# Altium footprint library baterries_and_accus.PcbLib: 26 footprints (part 1 of 2)
Each footprint in its own frame and in the unit in brackets; x right, y up, seen from the top. Pads: shape width x height; smd on the part's side, far side on the other; paste and mask are expansions set on the pad; w line width, h text height; cw(c..) or ccw(c..) is an arc to the next point about the centre after c.
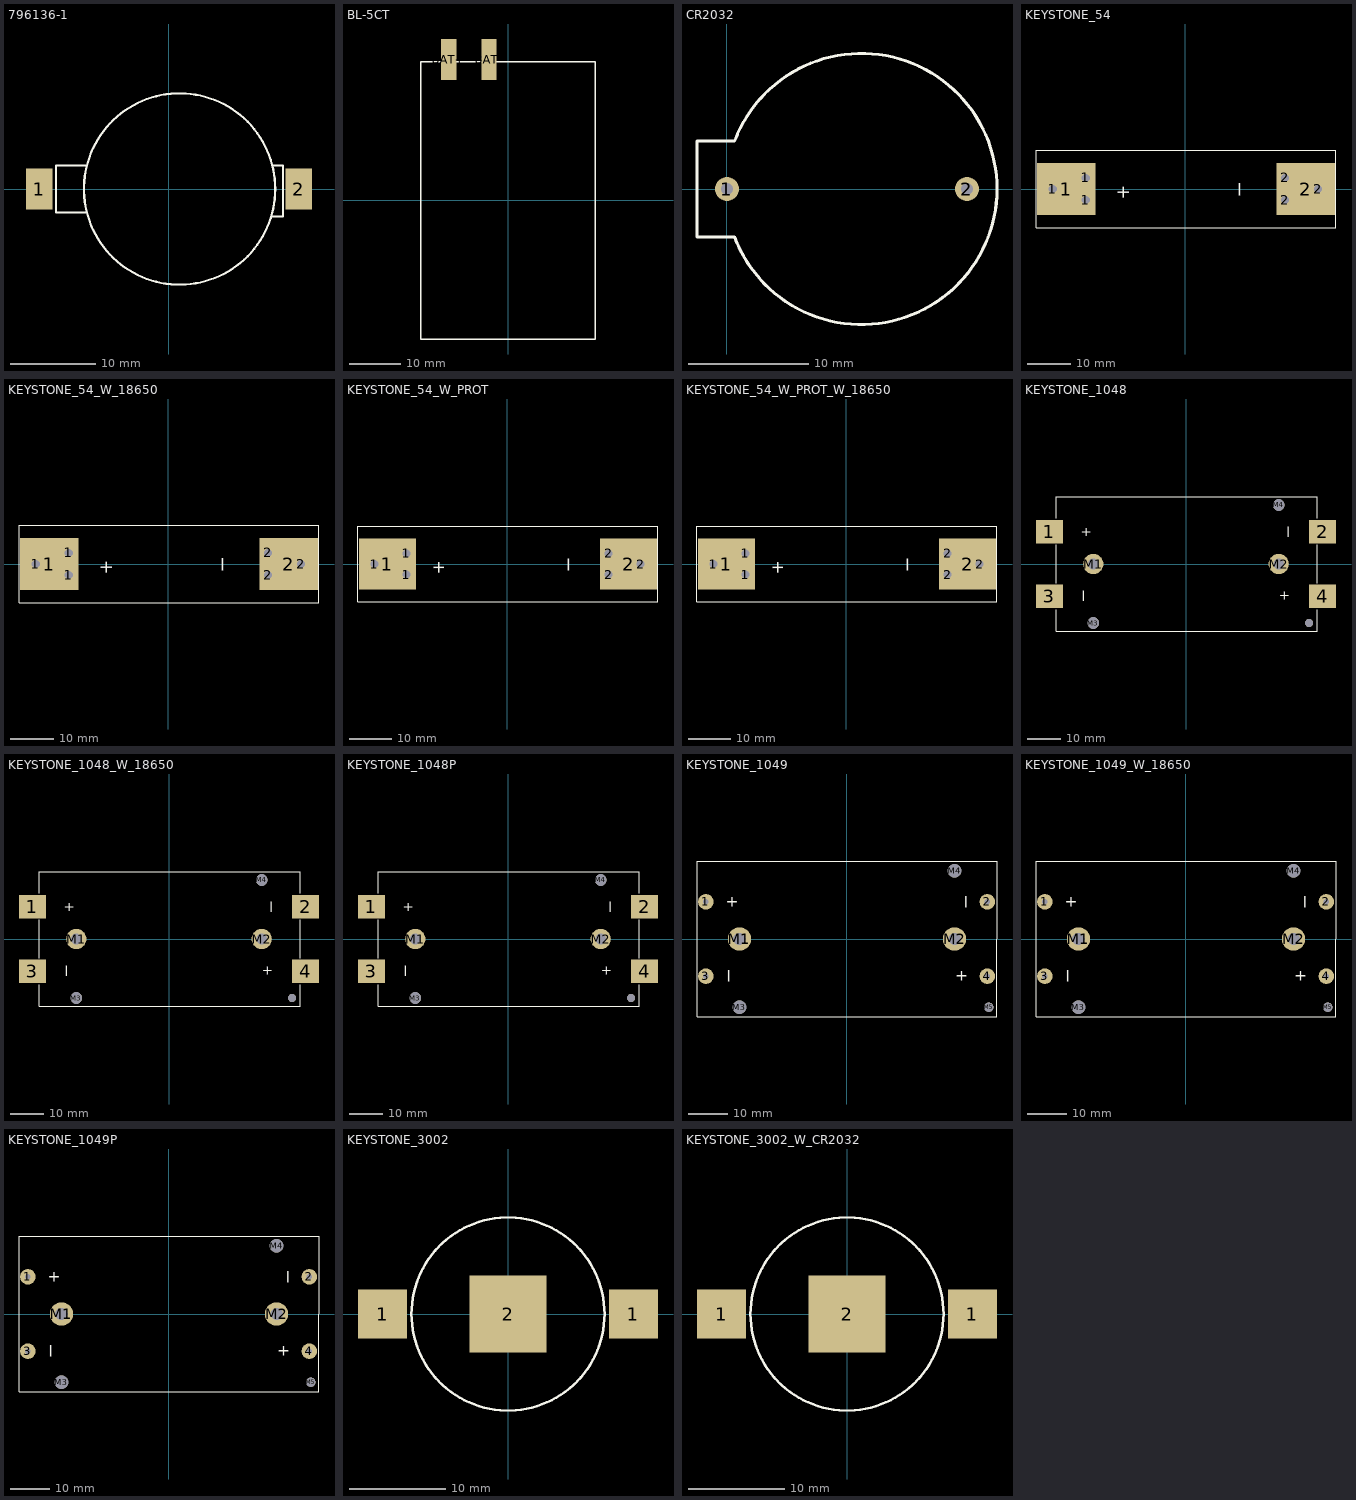
[diagram p0: the footprints below, top view; thin cyan lines are the x and y axes]

## 31x12x4 [mm]
height 4
3D body: height 4, standoff 0, extent 0,0 31,12

## 796136-1 [mm] "Tyco Electronics 796136-1 CR2032 SMD Battery Holder"
height 6.6
pads (2):
  rect 3.15x4.78 smd: 1(-15.25,0) 2(15.25,0)
Top Overlay:
  circle w0.254: c1.25,0 r11.25
  lines w0.256: -9.7,-2.75 -13.3,-2.75 -13.3,2.75 -9.7,2.75 ; 12.1,-3.25 13.4,-3.25 13.4,2.75 12.2,2.75
3D body "c-0796136-01-c-3d.stp": height 6.52, standoff -0.01, extent -16.159,-9.525 16.162,9.525

## BL-5CT [mm] "Nokia BL-5CT Battery"
height 5
pads (2):
  rect 3x8 smd: BAT+(-11.5,27.4) BAT-(-3.7,27.4)
Top Overlay:
  lines w0.254: -17,-27 -17,27 17,27 17,-27 -17,-27
3D body "User Library-BL-5CT.STEP": height 5.51, standoff 0, extent -17,-27 17,27

## CR2032 [mm]
height 5
pads (2):
  round 2 hole 1: 1(0,0) 2(20,0)
Top Overlay:
  lines w0.254: 0.617,-4 -2.5,-4 -2.5,4 0.618,4 ; 0.628,-3.989 ccw(c11.2,0) 0.64,4.023
3D body "User Library-BATTERY HOLDER CR2032.step": height 6.91, standoff -4, extent -4.7,-10.2 23.8,12.8

## KEYSTONE_54 [mm]
pads (8):
  round 4 hole 1.9: 1(-30.62,0) 1(-23,-2.54) 1(-23,2.54) 2(23,-2.54) 2(23,2.54) 2(30.62,0)
  rect 13.5x12 smd: 1(-27.5,0) 2(27.75,0)
Top Overlay:
  lines w0.2: -34.5,-9 -34.5,9 34.75,9 34.75,-9 -34.5,-9
  text "+" at -11.9,-2.5 h5
  text "l" at 11.9,-2.5 h5
3D body "keystone-PN54.STEP": height 18.3, standoff -3.05, extent -34.203,-9.051 -21.197,9.051
3D body "keystone-PN54.STEP": height 18.3, standoff -3.05, extent 21.197,-9.011 34.204,9.091

## KEYSTONE_54_W_18650 [mm]
pads (8):
  round 4 hole 1.9: 1(-30.62,0) 1(-23,-2.54) 1(-23,2.54) 2(23,-2.54) 2(23,2.54) 2(30.62,0)
  rect 13.5x12 smd: 1(-27.5,0) 2(27.75,0)
Top Overlay:
  lines w0.2: -34.5,-9 34.75,-9 34.75,9 -34.5,9 -34.5,-9
  text "l" at 11.9,-2.5 h5
  text "+" at -11.9,-2.5 h5
3D body "User Library-18650-1.step": height 19.3, standoff 1.3, extent -32.55,-9 32.55,9
3D body "keystone-PN54.STEP": height 18.3, standoff -3.05, extent 21.197,-9.011 34.204,9.091
3D body "keystone-PN54.STEP": height 18.3, standoff -3.05, extent -34.203,-9.051 -21.197,9.051

## KEYSTONE_54_W_PROT [mm]
pads (8):
  round 4 hole 1.9: 1(-31.62,0) 1(-24,-2.54) 1(-24,2.54) 2(24,-2.54) 2(24,2.54) 2(31.62,0)
  rect 13.5x12 smd: 1(-28.5,0) 2(28.75,0)
Top Overlay:
  lines w0.2: -35.5,-9 -35.5,9 35.75,9 35.75,-9 -35.5,-9
  text "+" at -14,-2.5 h5
  text "l" at 14,-2.5 h5
3D body "keystone-PN54.STEP": height 18.3, standoff -3.05, extent -35.257,-9.051 -22.25,9.051
3D body "keystone-PN54.STEP": height 18.3, standoff -3.05, extent 22.25,-9.051 35.257,9.051

## KEYSTONE_54_W_PROT_W_18650 [mm]
pads (8):
  round 4 hole 1.9: 1(-31.62,0) 1(-24,-2.54) 1(-24,2.54) 2(24,-2.54) 2(24,2.54) 2(31.62,0)
  rect 13.5x12 smd: 1(-28.5,0) 2(28.75,0)
Top Overlay:
  lines w0.2: -35.5,-9 35.75,-9 35.75,9 -35.5,9 -35.5,-9
  text "l" at 14,-2.5 h5
  text "+" at -14,-2.5 h5
3D body "keystone-PN54.STEP": height 18.3, standoff -3.05, extent 22.25,-9.051 35.257,9.051
3D body "keystone-PN54.STEP": height 18.3, standoff -3.05, extent -35.257,-9.051 -22.25,9.051
3D body "User Library-18650-1.step": height 19.3, standoff 1.3, extent -32.55,-9 32.55,9

## KEYSTONE_1048 [mm] "SMT double 18650 LiPo Holder"
pads (9):
  rect 8x7 smd: 1(-40.5,9.555) 2(40.5,9.555) 3(-40.5,-9.555) 4(40.5,-9.555)
  round 6 hole 3.2: M1(-27.5,0) M2(27.5,0)
  round 3.45 hole 3.5: M3(-27.5,-17.505) M4(27.5,17.505)
  round 2.4 hole 2.4: M5(36.5,-17.505)
Top Overlay:
  lines w0.2: -38.5,-13.5 -38.5,-20 39,-20 39,-13.5 ; -38.5,-5.75 -38.5,5.75 ; -38.5,13.5 -38.5,20 39,20 39,13.5 ; 39,-5.75 39,5.75
  text "+" at -31.2,7.21 h5
  text "l" at 31,11.9 h5
  text "l" at -31,-11.9 h5
  text "+" at 31,-7.21 h5
3D body "keystone-PN1048.STEP": height 14.88, standoff -3.46, extent -42.885,-19.9 43.069,19.876

## KEYSTONE_1048_W_18650 [mm] "SMT double 18650 LiPo Holder"
pads (9):
  rect 8x7 smd: 1(-40.5,9.555) 2(40.5,9.555) 3(-40.5,-9.555) 4(40.5,-9.555)
  round 6 hole 3.2: M1(-27.5,0) M2(27.5,0)
  round 3.45 hole 3.5: M3(-27.5,-17.505) M4(27.5,17.505)
  round 2.4 hole 2.4: M5(36.5,-17.505)
Top Overlay:
  lines w0.2: -38.5,-13.5 -38.5,-20 39,-20 39,-13.5 ; -38.5,-5.75 -38.5,5.75 ; -38.5,13.5 -38.5,20 39,20 39,13.5 ; 39,-5.75 39,5.75
  text "+" at -31.2,7.21 h5
  text "l" at 31,11.9 h5
  text "l" at -31,-11.9 h5
  text "+" at 31,-7.21 h5
3D body "keystone-PN1048.STEP": height 14.88, standoff -3.46, extent -42.885,-19.9 43.069,19.876
3D body "User Library-18650-1.step": height 18, standoff 0, extent -32.55,0.25 32.55,18.25
3D body "User Library-18650-1.step": height 18, standoff 0, extent -32.55,-18.25 32.55,-0.25

## KEYSTONE_1048P [mm] "SMT double 18650 LiPo Holder"
pads (9):
  rect 8x7 smd: 1(-40.5,9.555) 2(40.5,9.555) 3(-40.5,-9.555) 4(40.5,-9.555)
  round 6 hole 3.2: M1(-27.5,0) M2(27.5,0)
  round 3.45 hole 3.5: M3(-27.5,-17.505) M4(27.5,17.505)
  round 2.4 hole 2.4: M5(36.5,-17.505)
Top Overlay:
  lines w0.2: -38.5,-13.5 -38.5,-20 39,-20 39,-13.5 ; -38.5,-5.75 -38.5,5.75 ; -38.5,13.5 -38.5,20 39,20 39,13.5 ; 39,-5.75 39,5.75
  text "+" at -31.2,7.21 h5
  text "l" at 31,11.9 h5
  text "l" at -31,-11.9 h5
  text "+" at 31,-7.21 h5
3D body "keystone-PN1048P.STEP": height 14.91, standoff -3.43, extent -31.477,-11.825 54.477,27.952

## KEYSTONE_1049 [mm] "THT double 18650 LiPo Holder"
pads (9):
  round 4 hole 1.4: 1(-36.11,9.55) 2(36.11,9.55) 3(-36.11,-9.55) 4(36.11,-9.55)
  round 6 hole 3.2: M1(-27.5,0) M2(27.7,0)
  round 3.45 hole 3.5: M3(-27.5,-17.505) M4(27.7,17.5)
  round 2.4 hole 2.4: M5(36.5,-17.505)
Top Overlay:
  lines w0.2: -38.4,-19.9 -38.4,19.9 38.6,19.9 38.6,-19.9 -38.4,-19.9
  text "+" at -31,7.21 h5
  text "l" at 31.2,11.9 h5
  text "l" at -30.8,-11.9 h5
  text "+" at 31.2,-7.21 h5
3D body "keystone-PN1049.STEP": height 14.88, standoff -3.51, extent -38.4,-19.888 38.656,19.888

## KEYSTONE_1049_W_18650 [mm] "THT double 18650 LiPo Holder"
pads (9):
  round 4 hole 1.4: 1(-36.11,9.55) 2(36.11,9.55) 3(-36.11,-9.55) 4(36.11,-9.55)
  round 6 hole 3.2: M1(-27.5,0) M2(27.7,0)
  round 3.45 hole 3.5: M3(-27.5,-17.505) M4(27.7,17.5)
  round 2.4 hole 2.4: M5(36.5,-17.505)
Top Overlay:
  lines w0.2: -38.4,-19.9 38.6,-19.9 38.6,19.9 -38.4,19.9 -38.4,-19.9
  text "+" at 31.2,-7.21 h5
  text "l" at -30.8,-11.9 h5
  text "l" at 31.2,11.9 h5
  text "+" at -31,7.21 h5
3D body "keystone-PN1049.STEP": height 14.88, standoff -3.51, extent -38.4,-19.888 38.656,19.888
3D body "User Library-18650-1.step": height 18, standoff 0, extent -32.35,-18.25 32.75,-0.25
3D body "User Library-18650-1.step": height 18, standoff 0, extent -32.35,0.25 32.75,18.25

## KEYSTONE_1049P [mm] "THT double 18650 LiPo Holder"
pads (9):
  round 4 hole 1.4: 1(-36.11,9.55) 2(36.11,9.55) 3(-36.11,-9.55) 4(36.11,-9.55)
  round 6 hole 3.2: M1(-27.5,0) M2(27.7,0)
  round 3.45 hole 3.5: M3(-27.5,-17.505) M4(27.7,17.5)
  round 2.4 hole 2.4: M5(36.5,-17.505)
Top Overlay:
  lines w0.2: -38.4,-19.9 -38.4,19.9 38.6,19.9 38.6,-19.9 -38.4,-19.9
  text "+" at -31,7.21 h5
  text "l" at 31.2,11.9 h5
  text "l" at -30.8,-11.9 h5
  text "+" at 31.2,-7.21 h5
3D body "keystone-PN1049P.STEP": height 14.91, standoff -3.56, extent -26.228,-1.625 50.828,38.151

## KEYSTONE_3002 [mm] "CR2020, CR2025, CR2032 Battery Surface Mount Retainer"
pads (3):
  rect 5.08x5.08 smd: 1(-13,0) 1(13,0)
  rect 8x8 smd: 2(0,0)
Top Overlay:
  circle w0.254: c0,0 r10
3D body "keystone-PN3002.STEP": height 3.95, standoff -0.01, extent -15.38,-10.508 15.38,9.355

## KEYSTONE_3002_W_CR2032 [mm] "CR2020, CR2025, CR2032 Battery Surface Mount Retainer"
pads (3):
  rect 5.08x5.08 smd: 1(-13,0) 1(13,0)
  rect 8x8 smd: 2(0,0)
Top Overlay:
  circle w0.254: c0,0 r10
3D body "keystone-PN3002.STEP": height 3.95, standoff -0.01, extent -15.38,-10.508 15.38,9.355
3D body "CircuitWorks-BATT CR2032.step": height 3.3, standoff 0.1, extent -10,-10 10,10